# Altium footprint library fszhang.PcbLib: 1032 footprints (part 17 of 66)
Each footprint in its own frame and in the unit in brackets; x right, y up, seen from the top. Pads: shape width x height; smd on the part's side, far side on the other; paste and mask are expansions set on the pad; w line width, h text height; cw(c..) or ccw(c..) is an arc to the next point about the centre after c.
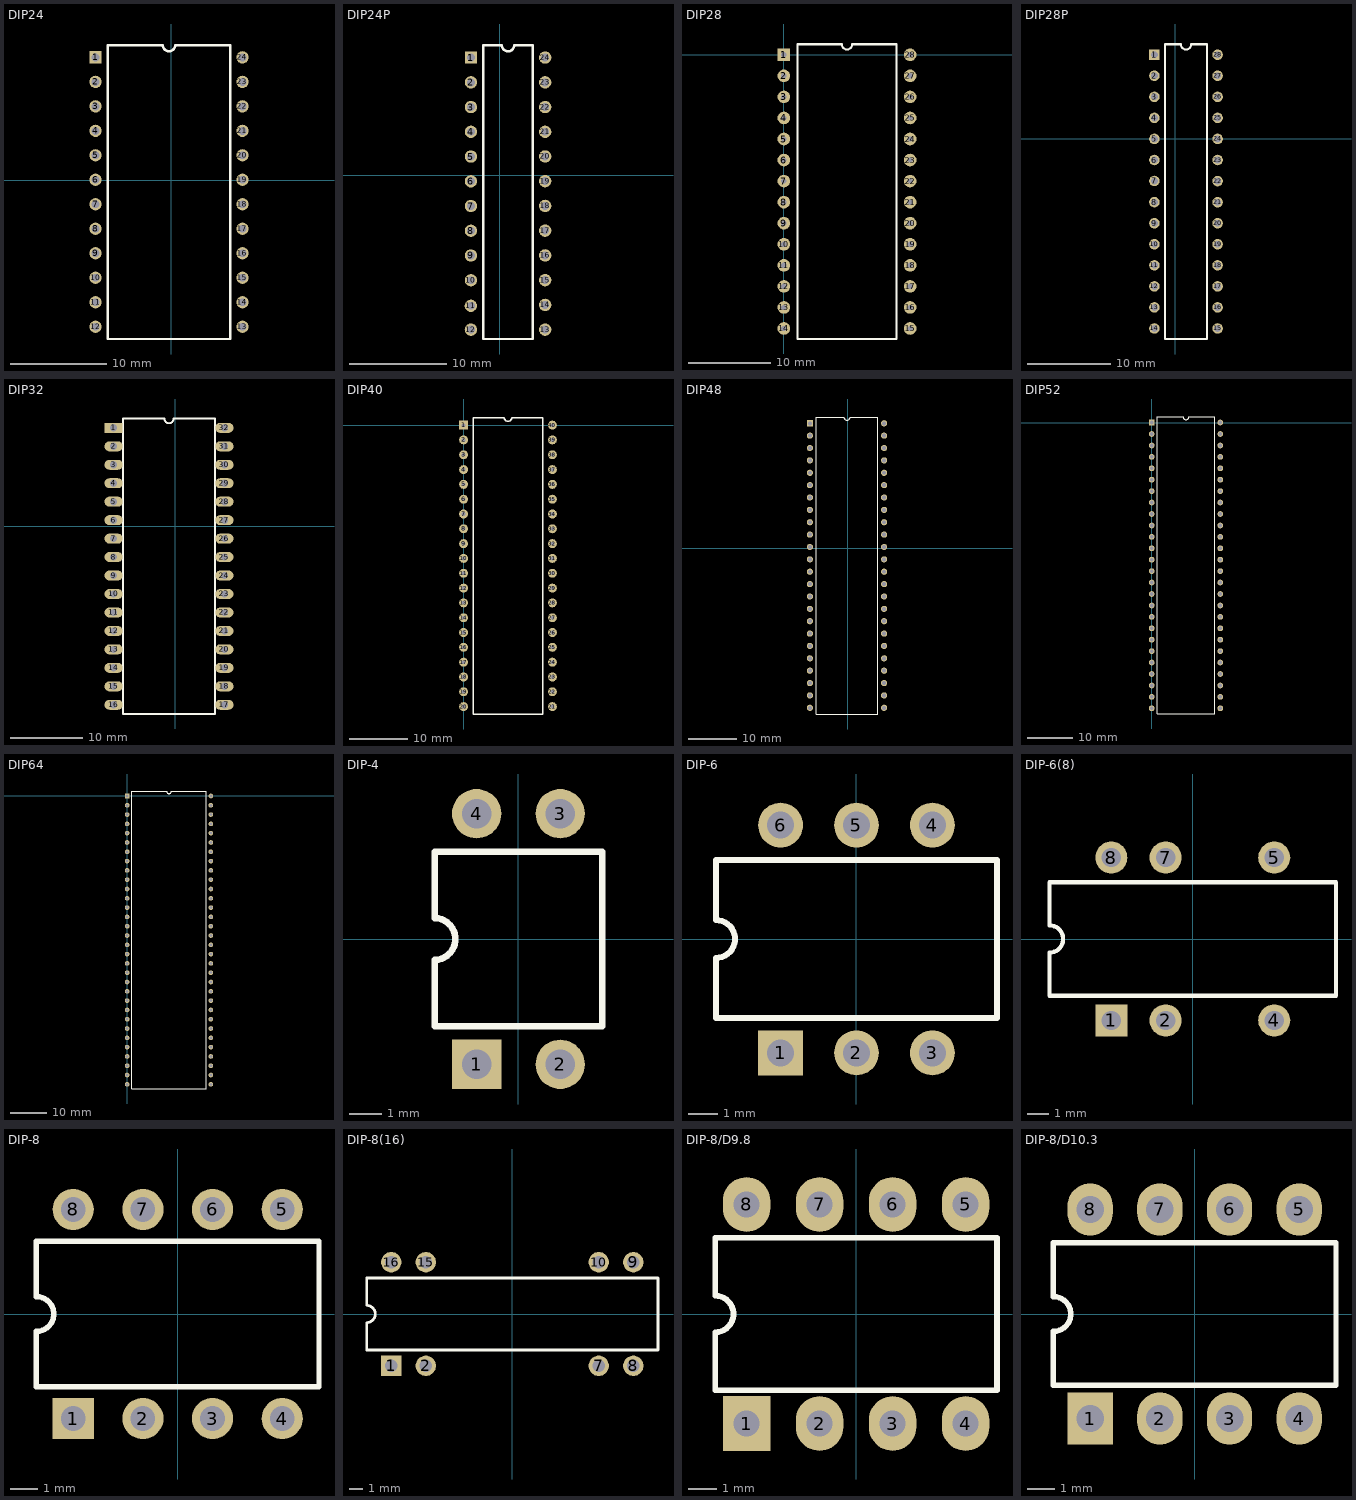
[diagram p16: the footprints below, top view; thin cyan lines are the x and y axes]

## DIP24 [mil]
pads (24):
  rect 50x50 hole 32: 1(-308.19,501.89)
  round 50 hole 32: 2(-308.19,401.89) 3(-308.19,301.89) 4(-308.19,201.89) 5(-308.19,101.89) 6(-308.19,1.89) 7(-308.19,-98.11) 8(-308.19,-198.11) 9(-308.19,-298.11) 10(-308.19,-398.11) 11(-308.19,-498.11) 12(-308.19,-598.11) 13(291.81,-598.11) 14(291.81,-498.11) 15(291.81,-398.11) 16(291.81,-298.11) 17(291.81,-198.11) 18(291.81,-98.11) 19(291.81,1.89) 20(291.81,101.89) 21(291.81,201.89) 22(291.81,301.89) 23(291.81,401.89) 24(291.81,501.89)
Top Overlay:
  lines w10: -258.19,-648.11 -258.19,551.89 -33.19,551.89 ccw(c-8.19,551.89) 16.81,551.89 241.81,551.89 241.81,-648.11 -258.19,-648.11

## DIP24P [mil] "窄体"
pads (24):
  rect 50x50 hole 32: 1(-116.38,475.28)
  round 50 hole 32: 2(-116.38,375.28) 3(-116.38,275.28) 4(-116.38,175.28) 5(-116.38,75.28) 6(-116.38,-24.72) 7(-116.38,-124.72) 8(-116.38,-224.72) 9(-116.38,-324.72) 10(-116.38,-424.72) 11(-116.93,-527.95) 12(-116.53,-624.41) 13(183.47,-624.41) 14(183.47,-524.41) 15(183.47,-424.41) 16(183.47,-324.41) 17(183.47,-224.41) 18(183.47,-124.41) 19(183.47,-24.41) 20(183.47,75.59) 21(183.62,175.28) 22(183.62,275.28) 23(183.62,375.28) 24(183.62,475.28)
Top Overlay:
  lines w10: -66.93,-662.21 133.07,-662.21 ; -66.93,-659.84 -66.38,525.27 8.62,525.27 ccw(c33.62,525.27) 58.62,525.27 133.62,525.27 133.86,-659.84

## DIP28 [mil]
pads (28):
  rect 60x60 hole 25: 1(0,0)
  round 60 hole 25: 2(0,-100) 3(0,-200) 4(0,-300) 5(0,-400) 6(0,-500) 7(0,-600) 8(0,-700) 9(0,-800) 10(0,-900) 11(0,-1000) 12(0,-1100) 13(0,-1200) 14(0,-1300) 15(600,-1300) 16(600,-1200) 17(600,-1100) 18(600,-1000) 19(600,-900) 20(600,-800) 21(600,-700) 22(600,-600) 23(600,-500) 24(600,-400) 25(600,-300) 26(600,-200) 27(600,-100) 28(600,0)
Top Overlay:
  lines w10: 65,-1350 65,50 275,50 ccw(c300,50) 325,50 535,50 535,-1350 65,-1350

## DIP28P [mil]
pads (28):
  rect 50x50 hole 32: 1(-99.43,399.13)
  round 50 hole 32: 2(-99.43,299.13) 3(-99.43,199.13) 4(-99.43,99.13) 5(-99.43,-0.87) 6(-99.43,-100.87) 7(-99.5,-200.5) 8(-99.5,-301) 9(-99.43,-401.37) 10(-99.43,-501.37) 11(-99.43,-601.37) 12(-99.43,-701.37) 13(-99.43,-801.37) 14(-99.43,-901.37) 15(200.57,-901.37) 16(200.57,-801.37) 17(200.57,-701.37) 18(200.57,-601.37) 19(200.57,-501.37) 20(200.57,-401.37) 21(200.57,-301.37) 22(200.57,-200.87) 23(200.57,-100.87) 24(200.57,-0.87) 25(200.57,99.13) 26(200.57,199.13) 27(200.57,299.13) 28(200.57,399.13)
Top Overlay:
  lines w10: -49.43,-251.37 -49.43,-951.37 150.57,-951.37 150.57,-251.37 ; -49.43,-250.87 -49.43,449.13 25.57,449.13 ccw(c50.57,449.13) 75.57,449.13 150.57,449.13 150.57,-250.87

## DIP32 [mm] "宽体"
pads (32):
  rect 2.5x1.38 hole 1: 1(-8.458,13.538)
  oval 2.5x1.38 hole 1: 2(-8.458,10.998) 3(-8.458,8.458) 4(-8.458,5.918) 5(-8.458,3.378) 6(-8.458,0.838) 7(-8.458,-1.702) 8(-8.458,-4.242) 9(-8.458,-6.782) 10(-8.458,-9.322) 11(-8.458,-11.862) 12(-8.458,-14.402) 13(-8.458,-16.942) 14(-8.458,-19.482) 15(-8.458,-22.022) 16(-8.458,-24.562) 17(6.782,-24.562) 18(6.782,-22.022) 19(6.782,-19.482) 20(6.782,-16.942) 21(6.782,-14.402) 22(6.782,-11.862) 23(6.782,-9.322) 24(6.782,-6.782) 25(6.782,-4.242) 26(6.782,-1.702) 27(6.782,0.838) 28(6.782,3.378) 29(6.782,5.918) 30(6.782,8.458) 31(6.782,10.998) 32(6.782,13.538)
Top Overlay:
  lines w0.254: -7.188,-25.832 -7.188,14.808 -1.473,14.808 ccw(c-0.838,14.808) -0.203,14.808 5.512,14.808 5.512,-25.832 -7.188,-25.832

## DIP40 [mil]
pads (40):
  rect 60x60 hole 25: 1(0,0)
  round 60 hole 25: 2(0,-100) 3(0,-200) 4(0,-300) 5(0,-400) 6(0,-500) 7(0,-600) 8(0,-700) 9(0,-800) 10(0,-900) 11(0,-1000) 12(0,-1100) 13(0,-1200) 14(0,-1300) 15(0,-1400) 16(0,-1500) 17(0,-1600) 18(0,-1700) 19(0,-1800) 20(0,-1900) 21(600,-1900) 22(600,-1800) 23(600,-1700) 24(600,-1600) 25(600,-1500) 26(600,-1400) 27(600,-1300) 28(600,-1200) 29(600,-1100) 30(600,-1000) 31(600,-900) 32(600,-800) 33(600,-700) 34(600,-600) 35(600,-500) 36(600,-400) 37(600,-300) 38(600,-200) 39(600,-100) 40(600,0)
Top Overlay:
  lines w10: 65,-1950 535,-1950 535,50 325,50 cw(c300,50) 275,50 65,50 65,-1950

## DIP48 [mm]
pads (48):
  rect 1.27x1.27 hole 0.813: 1(-7.81,25.62)
  round 1.27 hole 0.813: 2(-7.81,23.08) 3(-7.81,20.54) 4(-7.81,18) 5(-7.81,15.46) 6(-7.81,12.92) 7(-7.81,10.38) 8(-7.81,7.84) 9(-7.81,5.3) 10(-7.81,2.76) 11(-7.81,0.22) 12(-7.81,-2.32) 13(-7.81,-4.86) 14(-7.81,-7.4) 15(-7.81,-9.94) 16(-7.81,-12.48) 17(-7.81,-15.02) 18(-7.81,-17.56) 19(-7.81,-20.1) 20(-7.81,-22.64) 21(-7.81,-25.18) 22(-7.81,-27.72) 23(-7.81,-30.26) 24(-7.81,-32.8) 25(7.43,-32.8) 26(7.43,-30.26) 27(7.43,-27.72) 28(7.43,-25.18) 29(7.43,-22.64) 30(7.43,-20.1) 31(7.43,-17.56) 32(7.43,-15.02) 33(7.43,-12.48) 34(7.43,-9.94) 35(7.43,-7.4) 36(7.43,-4.86) 37(7.43,-2.32) 38(7.43,0.22) 39(7.43,2.76) 40(7.43,5.3) 41(7.43,7.84) 42(7.43,10.38) 43(7.43,12.92) 44(7.43,15.46) 45(7.43,18) 46(7.43,20.54) 47(7.43,23.08) 48(7.43,25.62)
Top Overlay:
  lines w0.254: -6.54,-34.07 -6.54,26.89 -0.825,26.89 ccw(c-0.19,26.89) 0.445,26.89 6.16,26.89 6.16,-34.07 -6.54,-34.07

## DIP52 [mil]
pads (52):
  rect 50x50 hole 32: 1(0,0)
  round 50 hole 32: 2(0,-100) 3(0,-200) 4(0,-300) 5(0,-400) 6(0,-500) 7(0,-600) 8(0,-700) 9(0,-800) 10(0,-900) 11(0,-1000) 12(0,-1100) 13(0,-1200) 14(0,-1300) 15(0,-1400) 16(0,-1500) 17(0,-1600) 18(0,-1700) 19(0,-1800) 20(0,-1900) 21(0,-2000) 22(0,-2100) 23(0,-2200) 24(0,-2300) 25(0,-2400) 26(0,-2500) 27(600,-2500) 28(600,-2400) 29(600,-2300) 30(600,-2200) 31(600,-2100) 32(600,-2000) 33(600,-1900) 34(600,-1800) 35(600,-1700) 36(600,-1600) 37(600,-1500) 38(600,-1400) 39(600,-1300) 40(600,-1200) 41(600,-1100) 42(600,-1000) 43(600,-900) 44(600,-800) 45(600,-700) 46(600,-600) 47(600,-500) 48(600,-400) 49(600,-300) 50(600,-200) 51(600,-100) 52(600,0)
Top Overlay:
  lines w10: 50,-2550 50,50 275,50 ccw(c300,50) 325,50 550,50 550,-2550 50,-2550

## DIP64 [mil]
pads (64):
  rect 50x50 hole 32: 1(0,0)
  round 50 hole 32: 2(0,-100) 3(0,-200) 4(0,-300) 5(0,-400) 6(0,-500) 7(0,-600) 8(0,-700) 9(0,-800) 10(0,-900) 11(0,-1000) 12(0,-1100) 13(0,-1200) 14(0,-1300) 15(0,-1400) 16(0,-1500) 17(0,-1600) 18(0,-1700) 19(0,-1800) 20(0,-1900) 21(0,-2000) 22(0,-2100) 23(0,-2200) 24(0,-2300) 25(0,-2400) 26(0,-2500) 27(0,-2600) 28(0,-2700) 29(0,-2800) 30(0,-2900) 31(0,-3000) 32(0,-3100) 33(900,-3100) 34(900,-3000) 35(900,-2900) 36(900,-2800) 37(900,-2700) 38(900,-2600) 39(900,-2500) 40(900,-2400) 41(900,-2300) 42(900,-2200) 43(900,-2100) 44(900,-2000) 45(900,-1900) 46(900,-1800) 47(900,-1700) 48(900,-1600) 49(900,-1500) 50(900,-1400) 51(900,-1300) 52(900,-1200) 53(900,-1100) 54(900,-1000) 55(900,-900) 56(900,-800) 57(900,-700) 58(900,-600) 59(900,-500) 60(900,-400) 61(900,-300) 62(900,-200) 63(900,-100) 64(900,0)
Top Overlay:
  lines w10: 50,-3150 850,-3150 850,50 475,50 cw(c450,50) 425,50 50,50 50,-3150

## DIP-4 [mm]
pads (4):
  rect 1.5x1.5 hole 0.9: 1(-1.27,-3.81)
  round 1.5 hole 0.9: 2(1.27,-3.81) 3(1.27,3.81) 4(-1.27,3.81)
Top Overlay:
  lines w0.2: -2.55,-2.65 2.55,-2.65 2.55,2.65 -2.55,2.65 -2.55,0.635 cw(c-2.55,0) -2.55,-0.635 -2.55,-2.65

## DIP-6 [mm]
pads (6):
  rect 1.5x1.5 hole 0.9: 1(-2.54,-3.81)
  round 1.5 hole 0.9: 2(0,-3.81) 3(2.54,-3.81) 4(2.54,3.81) 5(0,3.81) 6(-2.54,3.81)
Top Overlay:
  lines w0.2: -4.7,-2.65 4.7,-2.65 4.7,2.65 -4.7,2.65 -4.7,0.635 cw(c-4.7,0) -4.7,-0.635 -4.7,-2.65

## DIP-6(8) [mm]
pads (6):
  rect 1.5x1.5 hole 0.9: 1(-3.81,-3.81)
  round 1.5 hole 0.9: 2(-1.27,-3.81) 4(3.81,-3.81) 5(3.81,3.81) 7(-1.27,3.81) 8(-3.81,3.81)
Top Overlay:
  lines w0.2: -6.7,-2.65 -6.7,-0.635 ccw(c-6.7,0) -6.7,0.635 -6.7,2.65 6.7,2.65 6.7,-2.65 -6.7,-2.65

## DIP-8 [mm]
pads (8):
  rect 1.5x1.5 hole 0.9: 1(-3.81,-3.81)
  round 1.5 hole 0.9: 2(-1.27,-3.81) 3(1.27,-3.81) 4(3.81,-3.81) 5(3.81,3.81) 6(1.27,3.81) 7(-1.27,3.81) 8(-3.81,3.81)
Top Overlay:
  lines w0.2: -5.15,-2.65 -5.15,-0.635 ccw(c-5.15,0) -5.15,0.635 -5.15,2.65 5.15,2.65 5.15,-2.65 -5.15,-2.65

## DIP-8(16) [mm]
pads (8):
  rect 1.5x1.5 hole 0.9: 1(-8.89,-3.81)
  round 1.5 hole 0.9: 2(-6.35,-3.81) 7(6.35,-3.81) 8(8.89,-3.81) 9(8.89,3.81) 10(6.35,3.81) 15(-6.35,3.81) 16(-8.89,3.81)
Top Overlay:
  lines w0.2: -10.7,-2.65 -10.7,-0.635 ccw(c-10.7,0) -10.7,0.635 -10.7,2.65 10.7,2.65 10.7,-2.65 -10.7,-2.65

## DIP-8/D9.8 [mil]
pads (8):
  rect 65x75 hole 35.43: 1(-150,-150)
  oval 65x75 hole 35.43: 2(-50,-150) 3(50,-150) 4(150,-150) 5(150,150) 6(50,150) 7(-50,150) 8(-150,150)
Top Overlay:
  lines w7.87: -192.91,-104.33 -192.91,-25 ccw(c-192.91,0) -192.91,25 -192.91,104.33 192.91,104.33 192.91,-104.33 -192.91,-104.33

## DIP-8/D10.3 [mil]
pads (8):
  rect 65x75 hole 39.37: 1(-150,-150)
  oval 65x75 hole 39.37: 2(-50,-150) 3(50,-150) 4(150,-150) 5(150,150) 6(50,150) 7(-50,150) 8(-150,150)
Top Overlay:
  lines w7.87: -202.76,-102.36 202.76,-102.36 202.76,102.36 -202.76,102.36 -202.76,25 cw(c-202.76,0) -202.76,-25 -202.76,-102.36